# Altium footprint library UZ_A_Testboard.PcbLib: 19 footprints (part 2 of 2)
Each footprint in its own frame and in the unit in brackets; x right, y up, seen from the top. Pads: shape width x height; smd on the part's side, far side on the other; paste and mask are expansions set on the pad; w line width, h text height; cw(c..) or ccw(c..) is an arc to the next point about the centre after c.
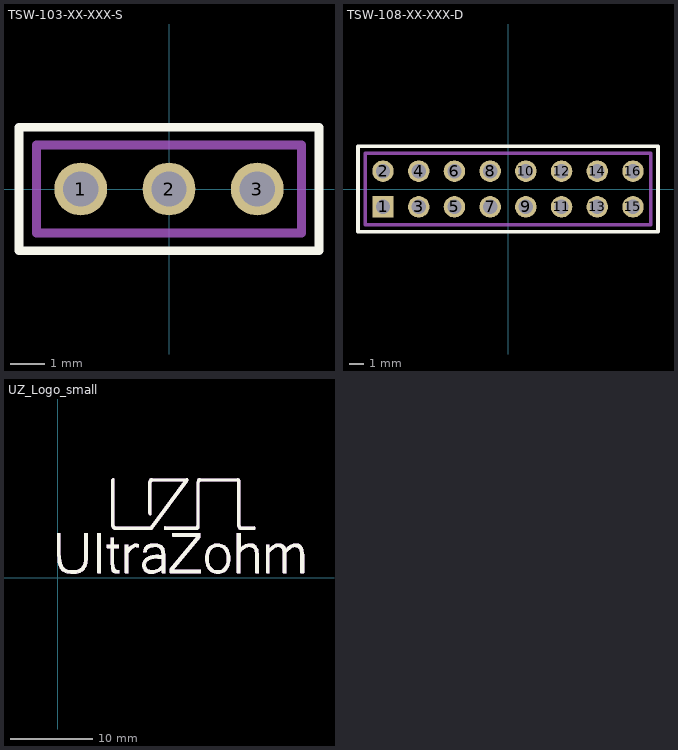
[diagram p1: the footprints below, top view; thin cyan lines are the x and y axes]

## TSW-103-XX-XXX-S [mil]
pads (3):
  round 60 hole 40 mask+3: 1(-100,0) 2(0,0) 3(100,0)
Top Overlay:
  lines w10: -170,-70 -170,70 170,70 170,-70 -170,-70
Mechanical 5:
  lines w10: -150,-50 -150,50 150,50 150,-50 -150,-50
  text ".Designator" at -10.32,-20 h30
3D body "TSW-103-07-F-S.stp": height 330, standoff -100, extent -155,-50 150,50

## TSW-108-XX-XXX-D [mil] "Pinheader, 2.54mm Pitch"
pads (16):
  rect 60x60 hole 40 mask+3: 1(-350,-50)
  round 60 hole 40 mask+3: 2(-350,50) 3(-250,-50) 4(-250,50) 5(-150,-50) 6(-150,50) 7(-50,-50) 8(-50,50) 9(50,-50) 10(50,50) 11(150,-50) 12(150,50) 13(250,-50) 14(250,50) 15(350,-50) 16(350,50)
Top Overlay:
  lines w10: -420,-120 420,-120 420,120 -420,120 -420,-120
Mechanical 5:
  lines w10: -400,-100 400,-100 400,100 -400,100 -400,-100
  text ".Designator" at 5.43,-20 h30
3D body "TSW-108-07-F-D.stp": height 330, standoff -100, extent -400,-100 400,100

## UZ_Logo_small [mm] "logo width 3cm"
Top Overlay:
  drawing of 354 lines, arcs and shapes, not listed
Mechanical 13:
  drawing of 354 lines, arcs and shapes, not listed